# Altium schematic symbol library SCHLIB.SchLib: 2608 symbols (part 2 of 20)
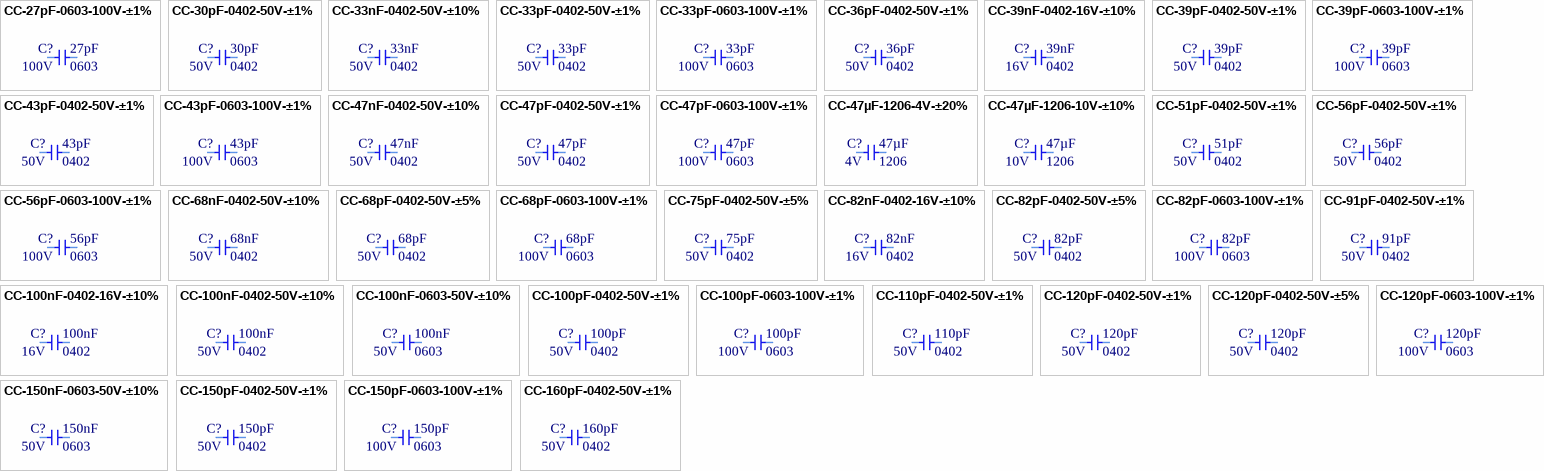
[diagram p84: symbols CC-27pF-0603-100V-±1% to CC-160pF-0402-50V-±1%]

## CC-160pF-0402-50V-±1%
designator C?, comment Voltage - Rated: 50V  Package: 0402  (hidden comment: 160pF)
CAP CER 160PF 50V C0G/NP0 0402; Manufacturer Part Number: GCM1555C1H161FA16D; Manufacturer: Murata Electronics; Tolerance: ±1%; Temperature Coefficient: C0G; Object  Type: Part; Design Item ID: CC-160pF-0402-50V-±1%; Series: GCM; Operating Temperature: -55°C ~ 125°C; Features: -; Ratings: AEC-Q200; Applications: Automotive; Failure Rate: -; Mounting Type: Surface Mount, MLCC; Size: 1.00mm x 0.50mm; Height: -; Thickness: 0.55mm; Category: Capacitor; Value: 160pF
footprint CC0402
pins: 1, 2

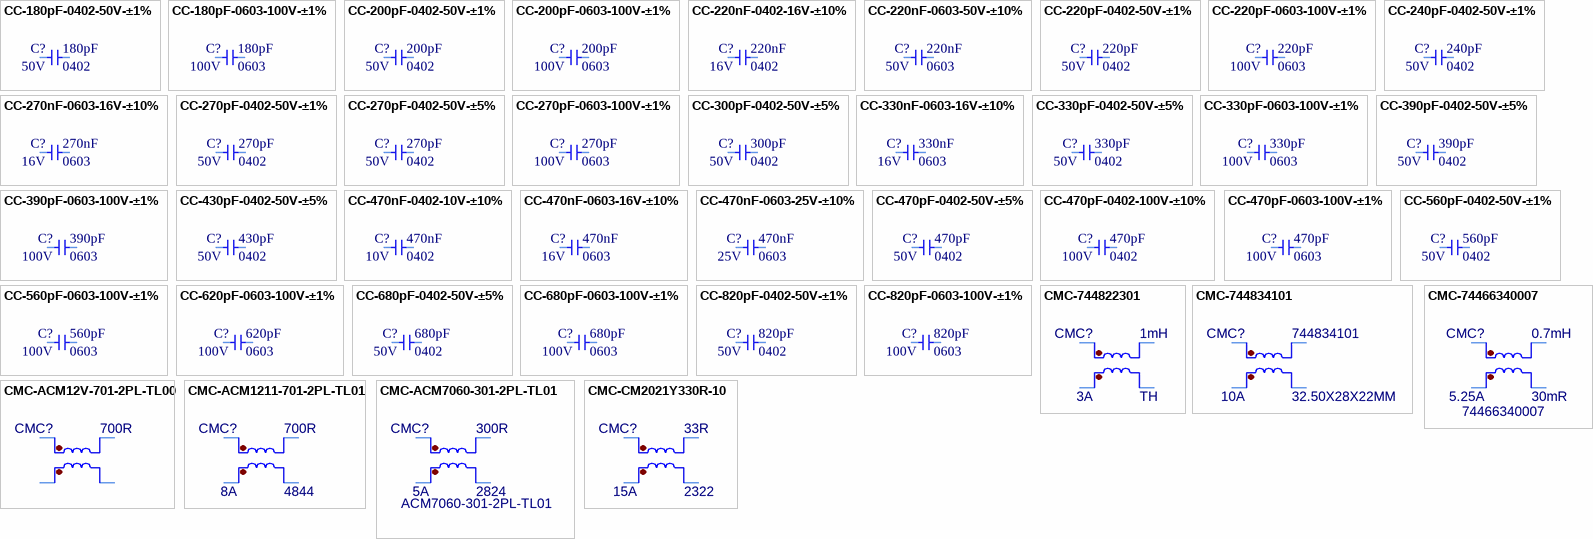
[diagram p4: symbols CC-180pF-0402-50V-±1% to CMC-CM2021Y330R-10]

## CC-180pF-0402-50V-±1%
designator C?, comment Voltage - Rated: 50V  Package: 0402  (hidden comment: 180pF)
CAP CER 180PF 50V C0G/NP0 0402; Manufacturer Part Number: GCM1555C1H181FA16D; Manufacturer: Murata Electronics; Tolerance: ±1%; Temperature Coefficient: C0G; Object  Type: Part; Design Item ID: CC-180pF-0402-50V-±1%; Series: GCM; Operating Temperature: -55°C ~ 125°C; Features: -; Ratings: AEC-Q200; Applications: Automotive; Failure Rate: -; Mounting Type: Surface Mount, MLCC; Size: 1.00mm x 0.50mm; Height: -; Thickness: 0.55mm; Category: Capacitor; Value: 180pF
footprint CC0402
pins: 1, 2

## CC-180pF-0603-100V-±1%
designator C?, comment Voltage - Rated: 100V  Package: 0603  (hidden comment: 180pF)
CAP CER 180PF 100V C0G/NP0 0603; Manufacturer Part Number: GCM1885C2A181FA16D; Manufacturer: Murata Electronics; Tolerance: ±1%; Temperature Coefficient: C0G; Object  Type: Part; Design Item ID: CC-180pF-0603-100V-±1%; Series: GCM; Operating Temperature: -55°C ~ 125°C; Features: -; Ratings: AEC-Q200; Applications: Automotive; Failure Rate: -; Mounting Type: Surface Mount, MLCC; Size: 1.60mm x 0.80mm; Height: -; Thickness: 0.90mm; Category: Capacitor; Value: 180pF
footprint CC0603
pins: 1, 2

## CC-200pF-0402-50V-±1%
designator C?, comment Voltage - Rated: 50V  Package: 0402  (hidden comment: 200pF)
CAP CER 200PF 50V C0G/NP0 0402; Manufacturer Part Number: GCM1555C1H201FA16D; Manufacturer: Murata Electronics; Tolerance: ±1%; Temperature Coefficient: C0G; Object  Type: Part; Design Item ID: CC-200pF-0402-50V-±1%; Series: GCM; Operating Temperature: -55°C ~ 125°C; Features: -; Ratings: AEC-Q200; Applications: Automotive; Failure Rate: -; Mounting Type: Surface Mount, MLCC; Size: 1.00mm x 0.50mm; Height: -; Thickness: 0.55mm; Category: Capacitor; Value: 200pF
footprint CC0402
pins: 1, 2

## CC-200pF-0603-100V-±1%
designator C?, comment Voltage - Rated: 100V  Package: 0603  (hidden comment: 200pF)
CAP CER 200PF 100V C0G/NP0 0603; Manufacturer Part Number: GCM1885C2A201FA16J; Manufacturer: Murata Electronics; Tolerance: ±1%; Temperature Coefficient: C0G; Object  Type: Part; Design Item ID: CC-200pF-0603-100V-±1%; Series: GCM; Operating Temperature: -55°C ~ 125°C; Features: -; Ratings: AEC-Q200; Applications: Automotive; Failure Rate: -; Mounting Type: Surface Mount, MLCC; Size: 1.60mm x 0.80mm; Height: -; Thickness: 0.90mm; Category: Capacitor; Value: 200pF
footprint CC0603
pins: 1, 2

## CC-220nF-0402-16V-±10%
designator C?, comment Voltage - Rated: 16V  Package: 0402  (hidden comment: 220nF)
CAP CER 0.22UF 16V X7R 0402; Manufacturer Part Number: GCM155R71C224KE02D; Manufacturer: Murata Electronics; Tolerance: ±10%; Temperature Coefficient: C0G; Object  Type: Part; Design Item ID: CC-220nF-0402-16V-±10%; Series: GCM; Operating Temperature: -55°C ~ 125°C; Features: -; Ratings: AEC-Q200; Applications: Automotive; Failure Rate: -; Mounting Type: Surface Mount, MLCC; Size: 1.00mm x 0.50mm; Height: -; Thickness: 0.55mm; Category: Capacitor; Value: 220nF
footprint CC0402
pins: 1, 2

## CC-220nF-0603-50V-±10%
designator C?, comment Voltage - Rated: 50V  Package: 0603  (hidden comment: 220nF)
CAP CER 0.22UF 50V X7R 0603; Manufacturer Part Number: GCM188R71H224KA64D; Manufacturer: Murata Electronics; Tolerance: ±10%; Object  Type: Part; Design Item ID: CC-220nF-0603-50V-±10%; Series: GCM; Temperature Coefficient: X7R; Operating Temperature: -55°C ~ 125°C; Features: -; Ratings: AEC-Q200; Applications: Automotive; Failure Rate: -; Mounting Type: Surface Mount, MLCC; Size: 1.60mm x 0.80mm; Height: -; Thickness: 0.90mm; Category: Capacitor; Value: 220nF
footprint CC0603
pins: 1, 2

## CC-220pF-0402-50V-±1%
designator C?, comment Voltage - Rated: 50V  Package: 0402  (hidden comment: 220pF)
CAP CER 220PF 50V C0G/NP0 0402; Manufacturer Part Number: GCM1555C1H221FA16D; Manufacturer: Murata Electronics; Tolerance: ±1%; Temperature Coefficient: C0G; Object  Type: Part; Design Item ID: CC-220pF-0402-50V-±1%; Series: GCM; Operating Temperature: -55°C ~ 125°C; Features: -; Ratings: AEC-Q200; Applications: Automotive; Failure Rate: -; Mounting Type: Surface Mount, MLCC; Size: 1.00mm x 0.50mm; Height: -; Thickness: 0.55mm; Category: Capacitor; Value: 220pF
footprint CC0402
pins: 1, 2

## CC-220pF-0603-100V-±1%
designator C?, comment Voltage - Rated: 100V  Package: 0603  (hidden comment: 220pF)
CAP CER 220PF 100V C0G/NP0 0603; Manufacturer Part Number: GCM1885C2A221FA16D; Manufacturer: Murata Electronics; Tolerance: ±1%; Temperature Coefficient: C0G; Object  Type: Part; Design Item ID: CC-220pF-0603-100V-±1%; Series: GCM; Operating Temperature: -55°C ~ 125°C; Features: -; Ratings: AEC-Q200; Applications: Automotive; Failure Rate: -; Mounting Type: Surface Mount, MLCC; Size: 1.60mm x 0.80mm; Height: -; Thickness: 0.90mm; Category: Capacitor; Value: 220pF
footprint CC0603
pins: 1, 2

## CC-240pF-0402-50V-±1%
designator C?, comment Voltage - Rated: 50V  Package: 0402  (hidden comment: 240pF)
CAP CER 240PF 50V C0G/NP0 0402; Manufacturer Part Number: GCM1555C1H241FA16D; Manufacturer: Murata Electronics; Tolerance: ±1%; Temperature Coefficient: C0G; Object  Type: Part; Design Item ID: CC-240pF-0402-50V-±1%; Series: GCM; Operating Temperature: -55°C ~ 125°C; Features: -; Ratings: AEC-Q200; Applications: Automotive; Failure Rate: -; Mounting Type: Surface Mount, MLCC; Size: 1.00mm x 0.50mm; Height: -; Thickness: 0.55mm; Category: Capacitor; Value: 240pF
footprint CC0402
pins: 1, 2

## CC-270nF-0603-16V-±10%
designator C?, comment Voltage - Rated: 16V  Package: 0603  (hidden comment: 270nF)
CAP CER 0.27UF 16V X7R 0603; Manufacturer Part Number: GCM188R71C274KA37D; Manufacturer: Murata Electronics; Tolerance: ±10%; Object  Type: Part; Design Item ID: CC-270nF-0603-16V-±10%; Series: GCM; Temperature Coefficient: X7R; Operating Temperature: -55°C ~ 125°C; Features: -; Ratings: AEC-Q200; Applications: Automotive; Failure Rate: -; Mounting Type: Surface Mount, MLCC; Size: 1.60mm x 0.80mm; Height: -; Thickness: 0.90mm; Category: Capacitor; Value: 270nF
footprint CC0603
pins: 1, 2

## CC-270pF-0402-50V-±1%
designator C?, comment Voltage - Rated: 50V  Package: 0402  (hidden comment: 270pF)
CAP CER 270PF 50V C0G/NP0 0402; Manufacturer Part Number: GCM1555C1H271FA16D; Manufacturer: Murata Electronics; Tolerance: ±1%; Temperature Coefficient: C0G; Object  Type: Part; Design Item ID: CC-270pF-0402-50V-±1%; Series: GCM; Operating Temperature: -55°C ~ 125°C; Features: -; Ratings: AEC-Q200; Applications: Automotive; Failure Rate: -; Mounting Type: Surface Mount, MLCC; Size: 1.00mm x 0.50mm; Height: -; Thickness: 0.55mm; Category: Capacitor; Value: 270pF
footprint CC0402
pins: 1, 2

## CC-270pF-0402-50V-±5%
designator C?, comment Voltage - Rated: 50V  Package: 0402  (hidden comment: 270pF)
CAP CER 270PF 50V C0G/NP0 0402; Manufacturer Part Number: GCM1555C1H271JA16D; Manufacturer: Murata Electronics; Tolerance: ±5%; Temperature Coefficient: C0G; Object  Type: Part; Design Item ID: CC-270pF-0402-50V-±5%; Series: GCM; Operating Temperature: -55°C ~ 125°C; Features: -; Ratings: AEC-Q200; Applications: Automotive; Failure Rate: -; Mounting Type: Surface Mount, MLCC; Size: 1.00mm x 0.50mm; Height: -; Thickness: 0.55mm; Category: Capacitor; Value: 270pF
footprint CC0402
pins: 1, 2

## CC-270pF-0603-100V-±1%
designator C?, comment Voltage - Rated: 100V  Package: 0603  (hidden comment: 270pF)
CAP CER 270PF 100V C0G/NP0 0603; Manufacturer Part Number: GCM1885C2A271FA16D; Manufacturer: Murata Electronics; Tolerance: ±1%; Temperature Coefficient: C0G; Object  Type: Part; Design Item ID: CC-270pF-0603-100V-±1%; Series: GCM; Operating Temperature: -55°C ~ 125°C; Features: -; Ratings: AEC-Q200; Applications: Automotive; Failure Rate: -; Mounting Type: Surface Mount, MLCC; Size: 1.60mm x 0.80mm; Height: -; Thickness: 0.90mm; Category: Capacitor; Value: 270pF
footprint CC0603
pins: 1, 2

## CC-300pF-0402-50V-±5%
designator C?, comment Voltage - Rated: 50V  Package: 0402  (hidden comment: 300pF)
CAP CER 300PF 50V NP0 0402; Manufacturer Part Number: GCM1555C1H301JA16D; Manufacturer: Murata Electronics; Tolerance: ±5%; Temperature Coefficient: C0G; Object  Type: Part; Design Item ID: CC-300pF-0402-50V-±5%; Series: GCM; Operating Temperature: -55°C ~ 125°C; Features: -; Ratings: AEC-Q200; Applications: Automotive; Failure Rate: -; Mounting Type: Surface Mount, MLCC; Size: 1.00mm x 0.50mm; Height: -; Thickness: 0.55mm; Category: Capacitor; Value: 300pF
footprint CC0402
pins: 1, 2

## CC-330nF-0603-16V-±10%
designator C?, comment Voltage - Rated: 16V  Package: 0603  (hidden comment: 330nF)
CAP CER 0.33UF 16V X7R 0603; Manufacturer Part Number: GCM188R71C334KA37D; Manufacturer: Murata Electronics; Tolerance: ±10%; Object  Type: Part; Design Item ID: CC-330nF-0603-16V-±10%; Series: GCM; Temperature Coefficient: X7R; Operating Temperature: -55°C ~ 125°C; Features: -; Ratings: AEC-Q200; Applications: Automotive; Failure Rate: -; Mounting Type: Surface Mount, MLCC; Size: 1.60mm x 0.80mm; Height: -; Thickness: 0.90mm; Category: Capacitor; Value: 330nF
footprint CC0603
pins: 1, 2

## CC-330pF-0402-50V-±5%
designator C?, comment Voltage - Rated: 50V  Package: 0402  (hidden comment: 330pF)
CAP CER 330PF 50V C0G/NP0 0402; Manufacturer Part Number: GCM1555C1H331JA16D; Manufacturer: Murata Electronics; Tolerance: ±5%; Temperature Coefficient: C0G; Object  Type: Part; Design Item ID: CC-330pF-0402-50V-±5%; Series: GCM; Operating Temperature: -55°C ~ 125°C; Features: -; Ratings: AEC-Q200; Applications: Automotive; Failure Rate: -; Mounting Type: Surface Mount, MLCC; Size: 1.00mm x 0.50mm; Height: -; Thickness: 0.55mm; Category: Capacitor; Value: 330pF
footprint CC0402
pins: 1, 2

## CC-330pF-0603-100V-±1%
designator C?, comment Voltage - Rated: 100V  Package: 0603  (hidden comment: 330pF)
CAP CER 330PF 100V C0G/NP0 0603; Manufacturer Part Number: GCM1885C2A331FA16D; Manufacturer: Murata Electronics; Tolerance: ±1%; Temperature Coefficient: C0G; Object  Type: Part; Design Item ID: CC-330pF-0603-100V-±1%; Series: GCM; Operating Temperature: -55°C ~ 125°C; Features: -; Ratings: AEC-Q200; Applications: Automotive; Failure Rate: -; Mounting Type: Surface Mount, MLCC; Size: 1.60mm x 0.80mm; Height: -; Thickness: 0.90mm; Category: Capacitor; Value: 330pF
footprint CC0603
pins: 1, 2

## CC-390pF-0402-50V-±5%
designator C?, comment Voltage - Rated: 50V  Package: 0402  (hidden comment: 390pF)
CAP CER 390PF 50V C0G/NP0 0402; Manufacturer Part Number: GCM1555C1H391JA16D; Manufacturer: Murata Electronics; Tolerance: ±5%; Temperature Coefficient: C0G; Object  Type: Part; Design Item ID: CC-390pF-0402-50V-±5%; Series: GCM; Operating Temperature: -55°C ~ 125°C; Features: -; Ratings: AEC-Q200; Applications: Automotive; Failure Rate: -; Mounting Type: Surface Mount, MLCC; Size: 1.00mm x 0.50mm; Height: -; Thickness: 0.55mm; Category: Capacitor; Value: 390pF
footprint CC0402
pins: 1, 2

## CC-390pF-0603-100V-±1%
designator C?, comment Voltage - Rated: 100V  Package: 0603  (hidden comment: 390pF)
CAP CER 390PF 100V C0G/NP0 0603; Manufacturer Part Number: GCM1885C2A391FA16D; Manufacturer: Murata Electronics; Tolerance: ±1%; Temperature Coefficient: C0G; Object  Type: Part; Design Item ID: CC-390pF-0603-100V-±1%; Series: GCM; Operating Temperature: -55°C ~ 125°C; Features: -; Ratings: AEC-Q200; Applications: Automotive; Failure Rate: -; Mounting Type: Surface Mount, MLCC; Size: 1.60mm x 0.80mm; Height: -; Thickness: 0.90mm; Category: Capacitor; Value: 390pF
footprint CC0603
pins: 1, 2

## CC-430pF-0402-50V-±5%
designator C?, comment Voltage - Rated: 50V  Package: 0402  (hidden comment: 430pF)
CAP CER 430PF 50V NP0 0402; Manufacturer Part Number: GCM1555C1H431JA16D; Manufacturer: Murata Electronics; Tolerance: ±5%; Temperature Coefficient: C0G; Object  Type: Part; Design Item ID: CC-430pF-0402-50V-±5%; Series: GCM; Operating Temperature: -55°C ~ 125°C; Features: -; Ratings: AEC-Q200; Applications: Automotive; Failure Rate: -; Mounting Type: Surface Mount, MLCC; Size: 1.00mm x 0.50mm; Height: -; Thickness: 0.55mm; Category: Capacitor; Value: 430pF
footprint CC0402
pins: 1, 2

## CC-470nF-0402-10V-±10%
designator C?, comment Voltage - Rated: 10V  Package: 0402  (hidden comment: 470nF)
CAP CER 0.47UF 10V X7S 0402; Manufacturer Part Number: GCM155C71A474KE36D; Manufacturer: Murata Electronics; Tolerance: ±10%; Temperature Coefficient: C0G; Object  Type: Part; Design Item ID: CC-470nF-0402-10V-±10%; Series: GCM; Operating Temperature: -55°C ~ 125°C; Features: -; Ratings: AEC-Q200; Applications: Automotive; Failure Rate: -; Mounting Type: Surface Mount, MLCC; Size: 1.00mm x 0.50mm; Height: -; Thickness: 0.60mm; Category: Capacitor; Value: 470nF
footprint CC0402
pins: 1, 2

## CC-470nF-0603-16V-±10%
designator C?, comment Voltage - Rated: 16V  Package: 0603  (hidden comment: 470nF)
CAP CER 0.47UF 16V X7R 0603; Manufacturer Part Number: GCM188R71C474KA55D; Manufacturer: Murata Electronics; Tolerance: ±10%; Object  Type: Part; Design Item ID: CC-470nF-0603-16V-±10%; Series: GCM; Temperature Coefficient: X7R; Operating Temperature: -55°C ~ 125°C; Features: -; Ratings: AEC-Q200; Applications: Automotive; Failure Rate: -; Mounting Type: Surface Mount, MLCC; Size: 1.60mm x 0.80mm; Height: -; Thickness: 0.90mm; Category: Capacitor; Value: 470nF
footprint CC0603
pins: 1, 2

## CC-470nF-0603-25V-±10%
designator C?, comment Voltage - Rated: 25V  Package: 0603  (hidden comment: 470nF)
CAP CER 0.47UF 25V X7R 0603; Manufacturer Part Number: GCM188R71E474KA64D; Manufacturer: Murata Electronics; Tolerance: ±10%; Object  Type: Part; Design Item ID: CC-470nF-0603-25V-±10%; Series: GCM; Temperature Coefficient: X7R; Operating Temperature: -55°C ~ 125°C; Features: -; Ratings: AEC-Q200; Applications: Automotive; Failure Rate: -; Mounting Type: Surface Mount, MLCC; Size: 1.60mm x 0.80mm; Height: -; Thickness: 0.90mm; Category: Capacitor; Value: 470nF
footprint CC0603
pins: 1, 2

## CC-470pF-0402-50V-±5%
designator C?, comment Voltage - Rated: 50V  Package: 0402  (hidden comment: 470pF)
CAP CER 470PF 50V C0G/NP0 0402; Manufacturer Part Number: GCM1555C1H471JA16D; Manufacturer: Murata Electronics; Tolerance: ±5%; Temperature Coefficient: C0G; Object  Type: Part; Design Item ID: CC-470pF-0402-50V-±5%; Series: GCM; Operating Temperature: -55°C ~ 125°C; Features: -; Ratings: AEC-Q200; Applications: Automotive; Failure Rate: -; Mounting Type: Surface Mount, MLCC; Size: 1.00mm x 0.50mm; Height: -; Thickness: 0.55mm; Category: Capacitor; Value: 470pF
footprint CC0402
pins: 1, 2

## CC-470pF-0402-100V-±10%
designator C?, comment Voltage - Rated: 100V  Package: 0402  (hidden comment: 470pF)
CAP CER 470PF 100V X7R 0402; Manufacturer Part Number: GCM155R72A471KA37D; Manufacturer: Murata Electronics; Tolerance: ±10%; Temperature Coefficient: C0G; Object  Type: Part; Design Item ID: CC-470pF-0402-100V-±10%; Series: GCM; Operating Temperature: -55°C ~ 125°C; Features: -; Ratings: AEC-Q200; Applications: Automotive; Failure Rate: -; Mounting Type: Surface Mount, MLCC; Size: 1.00mm x 0.50mm; Height: -; Thickness: 0.55mm; Category: Capacitor; Value: 470pF
footprint CC0402
pins: 1, 2

## CC-470pF-0603-100V-±1%
designator C?, comment Voltage - Rated: 100V  Package: 0603  (hidden comment: 470pF)
CAP CER 470PF 100V C0G/NP0 0603; Manufacturer Part Number: GCM1885C2A471FA16D; Manufacturer: Murata Electronics; Tolerance: ±1%; Temperature Coefficient: C0G; Object  Type: Part; Design Item ID: CC-470pF-0603-100V-±1%; Series: GCM; Operating Temperature: -55°C ~ 125°C; Features: -; Ratings: AEC-Q200; Applications: Automotive; Failure Rate: -; Mounting Type: Surface Mount, MLCC; Size: 1.60mm x 0.80mm; Height: -; Thickness: 0.90mm; Category: Capacitor; Value: 470pF
footprint CC0603
pins: 1, 2

## CC-560pF-0402-50V-±1%
designator C?, comment Voltage - Rated: 50V  Package: 0402  (hidden comment: 560pF)
CAP CER 560PF 50V C0G/NP0 0402; Manufacturer Part Number: GCM1555C1H561FA16D; Manufacturer: Murata Electronics; Tolerance: ±1%; Temperature Coefficient: C0G; Object  Type: Part; Design Item ID: CC-560pF-0402-50V-±1%; Series: GCM; Operating Temperature: -55°C ~ 125°C; Features: -; Ratings: AEC-Q200; Applications: Automotive; Failure Rate: -; Mounting Type: Surface Mount, MLCC; Size: 1.00mm x 0.50mm; Height: -; Thickness: 0.55mm; Category: Capacitor; Value: 560pF
footprint CC0402
pins: 1, 2

## CC-560pF-0603-100V-±1%
designator C?, comment Voltage - Rated: 100V  Package: 0603  (hidden comment: 560pF)
CAP CER 560PF 100V C0G/NP0 0603; Manufacturer Part Number: GCM1885C2A561FA16D; Manufacturer: Murata Electronics; Tolerance: ±1%; Temperature Coefficient: C0G; Object  Type: Part; Design Item ID: CC-560pF-0603-100V-±1%; Series: GCM; Operating Temperature: -55°C ~ 125°C; Features: -; Ratings: AEC-Q200; Applications: Automotive; Failure Rate: -; Mounting Type: Surface Mount, MLCC; Size: 1.60mm x 0.80mm; Height: -; Thickness: 0.90mm; Category: Capacitor; Value: 560pF
footprint CC0603
pins: 1, 2

## CC-620pF-0603-100V-±1%
designator C?, comment Voltage - Rated: 100V  Package: 0603  (hidden comment: 620pF)
CAP CER 620PF 100V C0G/NP0 0603; Manufacturer Part Number: GCM1885C2A621FA16J; Manufacturer: Murata Electronics; Tolerance: ±1%; Temperature Coefficient: C0G; Object  Type: Part; Design Item ID: CC-620pF-0603-100V-±1%; Series: GCM; Operating Temperature: -55°C ~ 125°C; Features: -; Ratings: AEC-Q200; Applications: Automotive; Failure Rate: -; Mounting Type: Surface Mount, MLCC; Size: 1.60mm x 0.80mm; Height: -; Thickness: 0.90mm; Category: Capacitor; Value: 620pF
footprint CC0603
pins: 1, 2

## CC-680pF-0402-50V-±5%
designator C?, comment Voltage - Rated: 50V  Package: 0402  (hidden comment: 680pF)
CAP CER 680PF 50V C0G/NP0 0402; Manufacturer Part Number: GCM1555C1H681JA16D; Manufacturer: Murata Electronics; Tolerance: ±5%; Temperature Coefficient: C0G; Object  Type: Part; Design Item ID: CC-680pF-0402-50V-±5%; Series: GCM; Operating Temperature: -55°C ~ 125°C; Features: -; Ratings: AEC-Q200; Applications: Automotive; Failure Rate: -; Mounting Type: Surface Mount, MLCC; Size: 1.00mm x 0.50mm; Height: -; Thickness: 0.55mm; Category: Capacitor; Value: 680pF
footprint CC0402
pins: 1, 2

## CC-680pF-0603-100V-±1%
designator C?, comment Voltage - Rated: 100V  Package: 0603  (hidden comment: 680pF)
CAP CER 680PF 100V C0G/NP0 0603; Manufacturer Part Number: GCM1885C2A681FA16D; Manufacturer: Murata Electronics; Tolerance: ±1%; Temperature Coefficient: C0G; Object  Type: Part; Design Item ID: CC-680pF-0603-100V-±1%; Series: GCM; Operating Temperature: -55°C ~ 125°C; Features: -; Ratings: AEC-Q200; Applications: Automotive; Failure Rate: -; Mounting Type: Surface Mount, MLCC; Size: 1.60mm x 0.80mm; Height: -; Thickness: 0.90mm; Category: Capacitor; Value: 680pF
footprint CC0603
pins: 1, 2

## CC-820pF-0402-50V-±1%
designator C?, comment Voltage - Rated: 50V  Package: 0402  (hidden comment: 820pF)
CAP CER 820PF 50V C0G/NP0 0402; Manufacturer Part Number: GCM1555C1H821FA16D; Manufacturer: Murata Electronics; Tolerance: ±1%; Temperature Coefficient: C0G; Object  Type: Part; Design Item ID: CC-820pF-0402-50V-±1%; Series: GCM; Operating Temperature: -55°C ~ 125°C; Features: -; Ratings: AEC-Q200; Applications: Automotive; Failure Rate: -; Mounting Type: Surface Mount, MLCC; Size: 1.00mm x 0.50mm; Height: -; Thickness: 0.55mm; Category: Capacitor; Value: 820pF
footprint CC0402
pins: 1, 2

## CC-820pF-0603-100V-±1%
designator C?, comment Package: 0603  Voltage - Rated: 100V  (hidden comment: 820pF)
CAP CER 820PF 100V C0G/NP0 0603; Manufacturer Part Number: GCM1885C2A821FA16D; Manufacturer: Murata Electronics; Temperature Coefficient: C0G; Object  Type: Part; Tolerance: ±1%; Design Item ID: CC-820pF-0603-100V-±1%; Series: GCM; Operating Temperature: -55°C ~ 125°C; Features: -; Ratings: AEC-Q200; Applications: Automotive; Failure Rate: -; Mounting Type: Surface Mount, MLCC; Size: 1.60mm x 0.80mm; Height: -; Thickness: 0.90mm; Category: Capacitor; Value: 820pF
footprint CC0603
pins: 1, 2

## CMC-744822301
designator CMC?, comment Max DC Current: 3A  Case/Package: TH  (hidden comment: 1mH)
CMC 1MH 3A 2LN TH; Manufacturer: Wurth Electronics; Manufacturer Part Number: 744822301; Tolerance: 30%; Number of Lines: 2; DC Resistance (DCR): 35mR; Test Frequency: 10kHz; Washability: OK; Supplier 1: Digi-Key; Stock 1: 422; Pricing 1: 1=4.29, 10=4.222, 50=3.349, 140=3.203, 280=2.912 (USD); Mount: Radial,Through Hole; Number of Pins: 4; Min Operating Temperature: -40°C; Max Operating Temperature: 125°C; Package Quantity: 140; Packaging: Bulk; Current: 3A; Termination: Radial; Inductance Tolerance: 30%; Resistance: 35MR; Current Rating: 3A; Series Resistance: 35mR; Length: 17.5mm; Height: 22mm; Width: 13mm; Depth: 13mm; Lead Pitch: 7.7mm; REACH SVHC: No SVHC; Lead Free: Lead Free; ComponentLink1URL: http://documents.rs-components.com/techlib://itc_doclist_GB.htm?stockno=4890201; ComponentLink1Description: http://documents.rs-components.com/techlib://itc_doclist_GB.htm?stockno=4890201; ComponentLink2URL: https://katalog.we-online.de/pbs/datasheet/744822301.pdf; ComponentLink2Description: https://katalog.we-online.de/pbs/datasheet/744822301.pdf; ComponentLink3URL: http://www.mouser.com/ds/2/445/744822301-91864.pdf; ComponentLink3Description: http://www.mouser.com/ds/2/445/744822301-91864.pdf; ComponentLink4URL: http://www.farnell.com/datasheets/1736520.pdf; ComponentLink4Description: http://www.farnell.com/datasheets/1736520.pdf; Supplier Part Number 1: 732-1439-ND; Inductance: 1mH
pins: 1, 2, 3, 4

## CMC-744834101
designator CMC?, comment 744834101  Current Rating (Max): 10A  Package: 32.50X28X22MM
COMMON MODE CHOKE 1MH 10A 2LN TH; Washability: OK
footprint CMC-744834101
pins: 1, 2, 3, 4

## CMC-74466340007
designator CMC?, comment 74466340007  Current: 5.25A  DC Resistance (DCR): 30mR  Inductance: 0.7mH
CHOKE COM MODE .7MH 4.0A SMD; Manufacturer: Wurth Electronics; Number of Lines: 2; Tolerance: 30%; Max DC Current: 4A; Washability: OK; Supplier 1: Digi-Key; Manufacturer Part Number: 74466340007; Stock 1: 1416; Pricing 1: 1=6.05000, 10=5.88000, 50=5.60000, 100=5.32000 (USD); RoHS: Yes; Mount: Surface Mount; Case/Package: SMD/SMT; Min Operating Temperature: -40°C; Max Operating Temperature: 125°C; Package Quantity: 1; Packaging: Tape and Reel; Length: 0.917inch; Height: 0.453inch; Width: 0.728inch; Depth: 23.3mm; ComponentLink1URL: https://datasheet.ciiva.com/1008/74466340007-1008595.pdf?src-supplier=Digi-Key; ComponentLink1Description: https://datasheet.ciiva.com/1008/74466340007-1008595.pdf?src-supplier=Digi-Key; ComponentLink2URL: https://datasheet.ciiva.com/11800/0900766b80d89638-11800510.pdf?src-supplier=RSComponents; ComponentLink2Description: https://datasheet.ciiva.com/11800/0900766b80d89638-11800510.pdf?src-supplier=RSComponents; ComponentLink3URL: https://datasheet.ciiva.com/1008/74466340007-1008596.pdf?src-supplier=Digi-Key; ComponentLink3Description: https://datasheet.ciiva.com/1008/74466340007-1008596.pdf?src-supplier=Digi-Key; ComponentLink4URL: https://datasheet.ciiva.com/1008/74466340007-1008597.pdf?src-supplier=Digi-Key; ComponentLink4Description: https://datasheet.ciiva.com/1008/74466340007-1008597.pdf?src-supplier=Digi-Key; Supplier Part Number 1: 732-1858-1-ND
footprint SMD23.3x18.5x11.5_4P (SMD Common Mode Power Line Choke, 4 leads)
pins: 1, 2, 3, 4

## CMC-ACM12V-701-2PL-TL00
designator CMC?, comment 700R
CMC 8A 2LN 700 OHM SMD AEC-Q200; Manufacturer: TDK EPCOS; Manufacturer Part Number: ACM12V-701-2PL-TL00; Core Material: Ferrite; Number of Lines: 2; DC Resistance (DCR): 6mR; Test Frequency: 100MHz; Insulation Resistance: 10MR; Shielding: Shielded; Washability: OK; ComponentLink1URL: https://datasheet.ciiva.com/1126/320973-1126960.pdf?src-supplier=Element14; ComponentLink1Description: https://datasheet.ciiva.com/1126/320973-1126960.pdf?src-supplier=Element14; ComponentLink2URL: https://datasheet.ciiva.com/6214/e9713-acm-v-6214330.pdf?src-supplier=Digi-Key; ComponentLink2Description: https://datasheet.ciiva.com/6214/e9713-acm-v-6214330.pdf?src-supplier=Digi-Key; ComponentLink3URL: https://datasheet.ciiva.com/6214/e9713-acm-v-6214331.pdf?src-supplier=Digi-Key; ComponentLink3Description: https://datasheet.ciiva.com/6214/e9713-acm-v-6214331.pdf?src-supplier=Digi-Key; ComponentLink4URL: https://datasheet.ciiva.com/4942/e9713-acm-v-13660-4942158.pdf?src-supplier=Mouser; ComponentLink4Description: https://datasheet.ciiva.com/4942/e9713-acm-v-13660-4942158.pdf?src-supplier=Mouser; Supplier 1: Digi-Key; Supplier Part Number 1: 445-4083-1-ND; Stock 1: 65877; Pricing 1: 1=2.71000, 10=2.50500, 100=1.75330 (USD); RoHS: Yes; Mount: Surface Mount; Case/Package: V; Case Code (Metric): 1211; Min Operating Temperature: -40°C; Max Operating Temperature: 125°C; Impedance: 700R; Package Quantity: 1; Packaging: Tape and Reel; Current Rating: 8A; Current: 8A; Max DC Current: 8A; Termination: SMD/SMT; DC Current: 8A; Length: 12mm; Height: 6mm; Width: 0.433inch; Depth: 11.3mm; REACH SVHC: No SVHC; Lead Free: Lead Free
footprint CMC-ACM12V-701-2PL-TL00 (CMC 8A 2LN 700 OHM SMD AEC-Q200)
pins: 1, 2, 3, 4

## CMC-ACM1211-701-2PL-TL01
designator CMC?, comment Max DC Current: 8A  Case/Package: 4844  (hidden comment: 700R)
CMC 8A 2LN 700 OHM SMD; Manufacturer: TDK; Manufacturer Part Number: ACM1211-701-2PL-TL01; Number of Lines: 2; Voltage Rating: 50V; DC Resistance (DCR): 6mR; Test Frequency: 100MHz; Voltage Rating (DC): 80V; Element Configuration: Dual; Shielding: Unshielded; Washability: OK; Supplier 1: Digi-Key; Stock 1: 30969; Pricing 1: 1=2.47, 10=2.277, 100=1.5939 (USD); Mount: Surface Mount; Number of Pins: 4; Min Operating Temperature: -40°C; Max Operating Temperature: 85°C; Packaging: Tape and Reel; Number of Elements: 2; Package Quantity: 1; Current Rating: 8A; Termination: SMD/SMT; Current: 8A; Length: 12.3mm; Height: 6mm; Width: 11mm; Depth: 11.3mm; Radiation Hardening: No; Lead Free: Lead Free; ComponentLink1URL: https://product.tdk.com/info/en/catalog/datasheets/cmf_commercial_power_acm1211_en.pdf; ComponentLink1Description: https://product.tdk.com/info/en/catalog/datasheets/cmf_commercial_power_acm1211_en.pdf; ComponentLink2URL: http://www.tdk.co.jp/tefe02/e9713_acm.pdf; ComponentLink2Description: http://www.tdk.co.jp/tefe02/e9713_acm.pdf; DC Current: 8A; Supplier Part Number 1: 445-2212-6-ND; Impedance: 700R
pins: 1, 2, 3, 4

## CMC-ACM7060-301-2PL-TL01
designator CMC?, comment ACM7060-301-2PL-TL01  Impedance: 300R  Case/Package: 2824  DC Current: 5A
CMC 5A 2LN 300 OHM SMD; Manufacturer: TDK; DC Resistance (DCR): 10mR; Test Frequency: 100MHz; Voltage Rating (DC): 80V; Number of Lines: 2; Element Configuration: Dual; Shielding: Unshielded; Washability: OK; Supplier 1: Digi-Key; Supplier Part Number 1: 445-2214-1-ND; Manufacturer Part Number: ACM7060-301-2PL-TL01; Stock 1: 72217; Pricing 1: 1=2.02000, 10=1.86300, 100=1.30410, 500=1.05570 (USD); RoHS: Yes; Mount: Surface Mount; Number of Pins: 4; Min Operating Temperature: -40°C; Max Operating Temperature: 85°C; Package Quantity: 1; Packaging: Tape and Reel; Max DC Current: 5A; Termination: SMD/SMT; Voltage Rating: 80V; Current Rating: 5A; Current: 5A; Insulation Resistance: 10MR; Length: 7.2mm; Height: 3.5mm; Width: 0.236inch; Depth: 6.2mm; Radiation Hardening: No; REACH SVHC: No SVHC; Lead Free: Lead Free; ComponentLink1URL: https://datasheet.ciiva.com/15191/getdatasheetpartid-659291-15191802.pdf?src-supplier=Verical; ComponentLink1Description: https://datasheet.ciiva.com/15191/getdatasheetpartid-659291-15191802.pdf?src-supplier=Verical; ComponentLink2URL: https://datasheet.ciiva.com/6216/e9713-acm-6216069.pdf?src-supplier=Digi-Key; ComponentLink2Description: https://datasheet.ciiva.com/6216/e9713-acm-6216069.pdf?src-supplier=Digi-Key; ComponentLink3URL: https://datasheet.ciiva.com/4942/e9713-acm-16715-4942071.pdf?src-supplier=Mouser; ComponentLink3Description: https://datasheet.ciiva.com/4942/e9713-acm-16715-4942071.pdf?src-supplier=Mouser; ComponentLink4URL: https://datasheet.ciiva.com/6216/e9713-acm-6216072.pdf?src-supplier=Digi-Key; ComponentLink4Description: https://datasheet.ciiva.com/6216/e9713-acm-6216072.pdf?src-supplier=Digi-Key; ComponentLink5URL: https://datasheet.ciiva.com/28376/e9713-acm-28376280.pdf?src-supplier=Avnet+Europe; ComponentLink5Description: https://datasheet.ciiva.com/28376/e9713-acm-28376280.pdf?src-supplier=Avnet+Europe; ComponentLink6URL: https://datasheet.ciiva.com/22726/1866262-22726282.pdf?src-supplier=Element14; ComponentLink6Description: https://datasheet.ciiva.com/22726/1866262-22726282.pdf?src-supplier=Element14; ComponentLink7URL: https://datasheet.ciiva.com/22726/1866262-22726284.pdf?src-supplier=Element14; ComponentLink7Description: https://datasheet.ciiva.com/22726/1866262-22726284.pdf?src-supplier=Element14; ComponentLink8URL: https://datasheet.ciiva.com/6216/e9713-acm-6216078.pdf?src-supplier=Digi-Key; ComponentLink8Description: https://datasheet.ciiva.com/6216/e9713-acm-6216078.pdf?src-supplier=Digi-Key
footprint FB-2824
pins: 1, 2, 3, 4

## CMC-CM2021Y330R-10
designator CMC?, comment Case Code (Imperial): 2322  Max DC Current: 15A  (hidden comment: 33R)
CMC 15A 2LN 33 OHM SMD; Manufacturer: Laird; Manufacturer Part Number: CM2021Y330R-10; Shielding: Unshielded; Number of Lines: 2; Test Frequency: 100MHz; DC Resistance (DCR): 0.75mR; Washability: OK; Supplier 1: Digi-Key; Stock 1: 77458; Pricing 1: 1=0.71, 10=0.621, 100=0.4437, 500=0.37268, 1000=0.3017 (USD); Mount: Surface Mount; Case/Package: 2021; Weight: 0.0128oz; Case Code (Metric): 5956; Min Operating Temperature: -40°C; Max Operating Temperature: 125°C; Package Quantity: 1; Packaging: Tape and Reel; Current Rating: 15A; Termination: SMD/SMT; Current: 15A; Frequency: 100MHz; Length: 0.231inch; Height: 3.8mm; Width: 5.6mm; Depth: 5.7mm; REACH SVHC: No SVHC; Lead Free: Lead Free; ComponentLink1URL: http://www.farnell.com/datasheets/1685869.pdf; ComponentLink1Description: http://www.farnell.com/datasheets/1685869.pdf; ComponentLink2URL: http://lairdtech.thomasnet.com/Asset/CM2021Y330R-10-E-2.pdf; ComponentLink2Description: http://lairdtech.thomasnet.com/Asset/CM2021Y330R-10-E-2.pdf; Supplier Part Number 1: 240-2502-6-ND; Impedance: 33R
footprint CMC-CM2021Y330R
pins: 1, 2, 3, 4

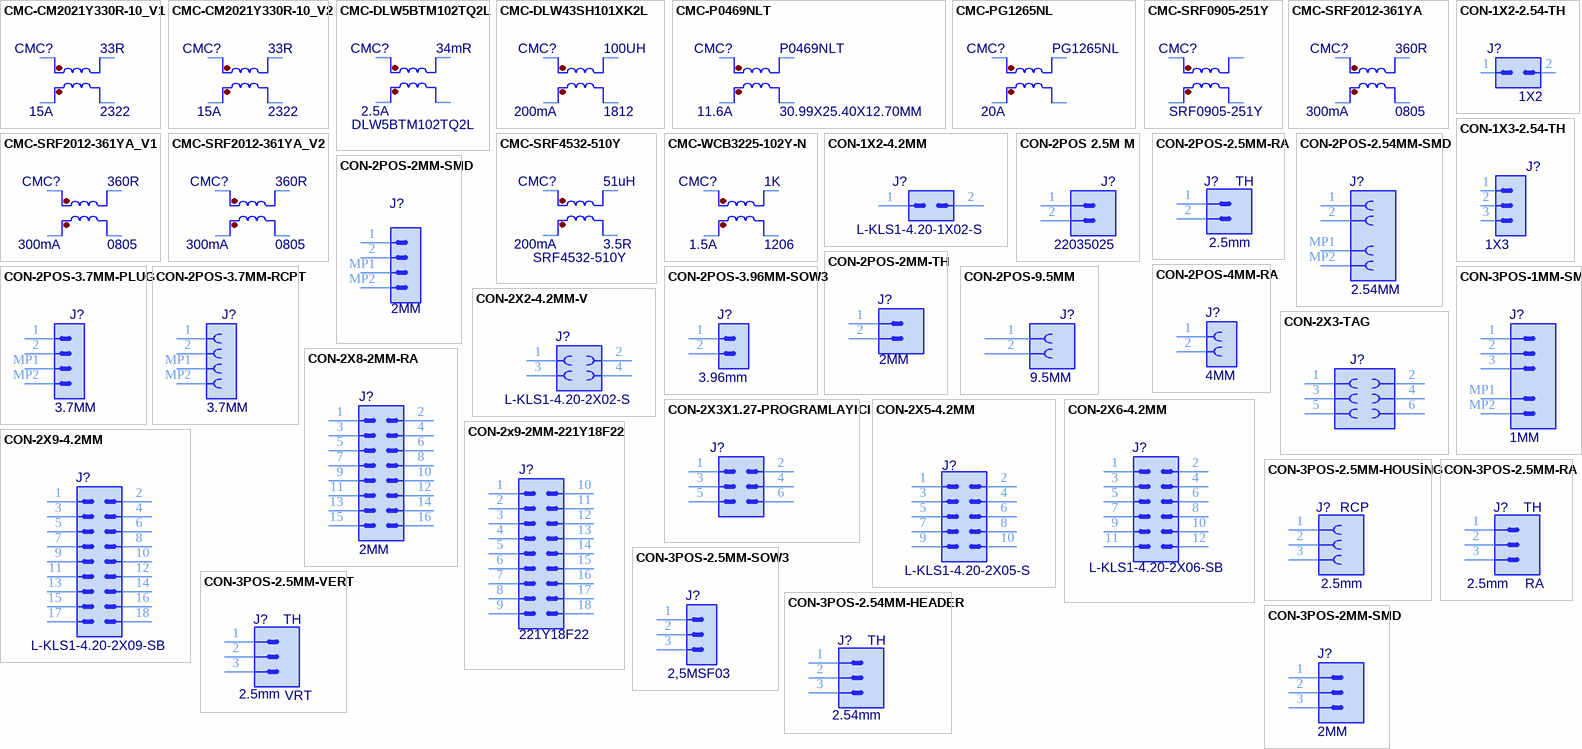
[diagram p5: symbols CMC-CM2021Y330R-10_V1 to CON-3POS-2MM-SMD]

## CMC-CM2021Y330R-10_V1
designator CMC?, comment Case Code (Imperial): 2322  Max DC Current: 15A  (hidden comment: 33R)
CMC 15A 2LN 33 OHM SMD; Manufacturer: Laird; Manufacturer Part Number: CM2021Y330R-10; Shielding: Unshielded; Number of Lines: 2; Test Frequency: 100MHz; DC Resistance (DCR): 0.75mR; Washability: OK; Supplier 1: Digi-Key; Stock 1: 77458; Pricing 1: 1=0.71, 10=0.621, 100=0.4437, 500=0.37268, 1000=0.3017 (USD); Mount: Surface Mount; Case/Package: 2021; Weight: 0.0128oz; Case Code (Metric): 5956; Min Operating Temperature: -40°C; Max Operating Temperature: 125°C; Package Quantity: 1; Packaging: Tape and Reel; Current Rating: 15A; Termination: SMD/SMT; Current: 15A; Frequency: 100MHz; Length: 0.231inch; Height: 3.8mm; Width: 5.6mm; Depth: 5.7mm; REACH SVHC: No SVHC; Lead Free: Lead Free; ComponentLink1URL: http://www.farnell.com/datasheets/1685869.pdf; ComponentLink1Description: http://www.farnell.com/datasheets/1685869.pdf; ComponentLink2URL: http://lairdtech.thomasnet.com/Asset/CM2021Y330R-10-E-2.pdf; ComponentLink2Description: http://lairdtech.thomasnet.com/Asset/CM2021Y330R-10-E-2.pdf; Supplier Part Number 1: 240-2502-6-ND; Impedance: 33R
footprint CMC-CM2021Y330R
pins: 1, 2, 3, 4

## CMC-CM2021Y330R-10_V2
designator CMC?, comment Case Code (Imperial): 2322  Max DC Current: 15A  (hidden comment: 33R)
CMC 15A 2LN 33 OHM SMD; Manufacturer: Laird; Manufacturer Part Number: CM2021Y330R-10; Shielding: Unshielded; Number of Lines: 2; Test Frequency: 100MHz; DC Resistance (DCR): 0.75mR; Washability: OK; Supplier 1: Digi-Key; Stock 1: 77458; Pricing 1: 1=0.71, 10=0.621, 100=0.4437, 500=0.37268, 1000=0.3017 (USD); Mount: Surface Mount; Case/Package: 2021; Weight: 0.0128oz; Case Code (Metric): 5956; Min Operating Temperature: -40°C; Max Operating Temperature: 125°C; Package Quantity: 1; Packaging: Tape and Reel; Current Rating: 15A; Termination: SMD/SMT; Current: 15A; Frequency: 100MHz; Length: 0.231inch; Height: 3.8mm; Width: 5.6mm; Depth: 5.7mm; REACH SVHC: No SVHC; Lead Free: Lead Free; ComponentLink1URL: http://www.farnell.com/datasheets/1685869.pdf; ComponentLink1Description: http://www.farnell.com/datasheets/1685869.pdf; ComponentLink2URL: http://lairdtech.thomasnet.com/Asset/CM2021Y330R-10-E-2.pdf; ComponentLink2Description: http://lairdtech.thomasnet.com/Asset/CM2021Y330R-10-E-2.pdf; Supplier Part Number 1: 240-2502-6-ND; Impedance: 33R
footprint CMC-CM2021Y330R
pins: 1, 2, 3, 4

## CMC-DLW5BTM102TQ2L
designator CMC?, comment DLW5BTM102TQ2L  DC Resistance (DCR): 34mR  Max Current Rating: 2.5A
CMC 2.5A 2LN 1 KOHM SMD; Manufacturer: Murata; Number of Lines: 2; Voltage Rating (DC): 50V; Impedance: 1kR; Supplier 1: Digi-Key; Supplier Part Number 1: 490-14403-1-ND; Manufacturer Part Number: DLW5BTM102TQ2L; Pricing: 1=1.19, 10=1.102, 25=1.0168, 50=0.8474, 100=0.7966, 250=0.7119 (USD); RoHS: No; Mount: Surface Mount; Min Operating Temperature: -40°C; Max Operating Temperature: 105°C; Packaging: Tape and Reel; Length: 5mm; Width: 5mm; Lead Free: Lead Free; ComponentLink1URL: https://www.murata.com/en-us/products/productdata/8796761587742/EFLC0025.pdf?src-supplier=Digi-Key; ComponentLink1Description: https://www.murata.com/en-us/products/productdata/8796761587742/EFLC0025.pdf?src-supplier=Digi-Key; Stock: 6882
footprint CMC-DLW5BTM
pins: 1, 2, 3, 4

## CMC-DLW43SH101XK2L
designator CMC?, comment 100UH  Case/Package: 1812  DC Current: 200mA
CMC 100UH 200MA 2LN SMD AEC-Q200; Manufacturer: Murata; Manufacturer Part Number: DLW43SH101XK2L; Number of Lines: 2; Tolerance: 50%; Voltage Rating: 50V; Shielding: Unshielded; DC Resistance (DCR): 2R; Test Frequency: 1MHz; Washability: OK; Supplier 1: Digi-Key; Stock 1: 114520; Pricing 1: 1 = 1.25000, 10 = 1.16400, 100 = 0.84130 (USD); RoHS: Yes; Mount: Surface Mount; Weight: 0.005997oz; Case Code (Metric): 4532; Case Code (Imperial): 1812; Min Operating Temperature: -40°C; Max Operating Temperature: 125°C; Package Quantity: 1; Packaging: Tape and Reel; Current Rating: 200mA; Inductance: 100uH; Current: 200mA; Max DC Current: 200mA; Termination: SMD/SMT; Military Standard: Not; Length: 4.5mm; Height: 2.6mm; Width: 0.126inch; Depth: 3.4mm; Radiation Hardening: No; REACH SVHC: No SVHC; Lead Free: Lead Free; ComponentLink1URL: https://www.verical.com/server-webapp/html/getDatasheet?partID=442532&src-supplier=Verical; ComponentLink1Description: https://www.verical.com/server-webapp/html/getDatasheet?partID=442532&src-supplier=Verical; ComponentLink2URL: http://search.murata.co.jp/Ceramy/image/img/PDF/ENG/L0132S0197DLW43S.pdf?src-supplier=Avnet; ComponentLink2Description: http://search.murata.co.jp/Ceramy/image/img/PDF/ENG/L0132S0197DLW43S.pdf?src-supplier=Avnet; ComponentLink3URL: http://www.murata.com/en-eu/products/productdata/8796758605854/QFLC9101.pdf?src-supplier=Digi-Key; ComponentLink3Description: http://www.murata.com/en-eu/products/productdata/8796758605854/QFLC9101.pdf?src-supplier=Digi-Key; ComponentLink4URL: http://search.murata.co.jp/Ceramy/image/img/PDF/ENG/L0132S0197DLW43S.pdf?src-supplier=Avnet+Europe; ComponentLink4Description: http://search.murata.co.jp/Ceramy/image/img/PDF/ENG/L0132S0197DLW43S.pdf?src-supplier=Avnet+Europe; ComponentLink5URL: http://www.murata.com/products/catalog/pdf/k35e.pdf?src-supplier=Future+Electronics; ComponentLink5Description: http://www.murata.com/products/catalog/pdf/k35e.pdf?src-supplier=Future+Electronics; ComponentLink6URL: https://media.digikey.com/pdf/Data%20Sheets/Murata%20PDFs/DLx_Series.pdf?src-supplier=Digi-Key; ComponentLink6Description: https://media.digikey.com/pdf/Data%20Sheets/Murata%20PDFs/DLx_Series.pdf?src-supplier=Digi-Key; Supplier Part Number 1: 490-7979-1-ND
footprint CMC-1812
pins: 1, 2, 3, 4

## CMC-P0469NLT
designator CMC?, comment P0469NLT  Current: 11.6A  Case/Package: 30.99X25.40X12.70MM
COMMON MODE CHOKE 11.6A 2LN SMD; Manufacturer: Pulse Electronics; Inductance: 630uH; DC Resistance (DCR): 10mR; Tolerance: 35%; Number of Lines: 2; Shielding: Unshielded; Washability: OK; Supplier 1: Digi-Key; Manufacturer Part Number: P0469NLT; Stock 1: 4290; Pricing 1: 1=4.24, 10=3.887 (USD); Mount: Surface Mount; Number of Pins: 4; Min Operating Temperature: -40°C; Max Operating Temperature: 120°C; Packaging: Tape and Reel; Max DC Current: 11.6A; DC Current: 11.6A; Military Standard: Not; Package Quantity: 1; Termination: SMD/SMT; Length: 30.99mm; Height: 12.7mm; Depth: 25.4mm; Width: 1inch; Radiation Hardening: No; REACH SVHC: No SVHC; ComponentLink1URL: http://uk.rs-online.com/webdocs/0fe2/0900766b80fe229e.pdf?src-supplier=RSComponents; ComponentLink1Description: http://uk.rs-online.com/webdocs/0fe2/0900766b80fe229e.pdf?src-supplier=RSComponents; ComponentLink2URL: http://productfinder.pulseeng.com/products/datasheets/SPM2007_63.pdf?src-supplier=Digi-Key; ComponentLink2Description: http://productfinder.pulseeng.com/products/datasheets/SPM2007_63.pdf?src-supplier=Digi-Key; Supplier Part Number 1: 553-1938-1-ND
footprint CMC-P0469NLT
pins: 1, 2, 3, 4

## CMC-PG1265NL
designator CMC?, comment PG1265NL  Max Current Rating: 20A
COMMON MODE CHOKE 20A 2LN SMD; Manufacturer: Pulse; Number of Lines: 2; DC Resistance (DCR): 4.1mR; Supplier 1: Digi-Key; Supplier Part Number 1: 553-3913-5-ND; Manufacturer Part Number: PG1265NL; Stock: 2073; Pricing: 1=3.54, 10=3.245, 25=2.95, 50=2.478, 100=2.124, 250=2.006, 500=1.888, 1000=1.77, 2500=1.711 (USD); RoHS: Yes; Mount: Surface Mount; Min Operating Temperature: -40°C; Max Operating Temperature: 130°C; Package Quantity: 20; Packaging: Tray; Length: 1.22inch; Width: 1inch; Height: 0.5inch; ComponentLink1URL: http://productfinder.pulseeng.com/products/datasheets/P688.pdf?src-supplier=Digi-Key; ComponentLink1Description: http://productfinder.pulseeng.com/products/datasheets/P688.pdf?src-supplier=Digi-Key; ComponentLink2URL: https://productfinder.pulseeng.com/doc_type/WEB301/doc_num/P688/doc_part/P688.pdf?src-supplier=Digi-Key; ComponentLink2Description: https://productfinder.pulseeng.com/doc_type/WEB301/doc_num/P688/doc_part/P688.pdf?src-supplier=Digi-Key
footprint CMC-P0469NLT
pins: 1, 2, 3, 4

## CMC-SRF0905-251Y
designator CMC?, comment SRF0905-251Y
BOURNS   SRF0905-251Y   COMMON MODE CHOKE, 250UH, 1.2A, 50%; Core Material: Ferrite; Voltage Rating (DC): 50V; Impedance: 600R; Number of Lines: 2; Frequency: 20MHz; DC Resistance (DCR): 130mR; Test Frequency: 100kHz; Element Configuration: Dual; Washability: OK; Supplier 1: Digi-Key; Manufacturer: Bourns; Manufacturer Part Number: SRF0905-251Y; Stock 1: 23724; Pricing 1: 1=1.45000, 10=1.34600, 100=0.97290, 500=0.74520 (USD); RoHS: Yes; Mount: Surface Mount; Case/Package: 0905; Number of Pins: 4; Material: Polymer; Min Operating Temperature: -40°C; Max Operating Temperature: 105°C; Tolerance: 50%; Packaging: Tape and Reel; Package Quantity: 1000; Inductance: 250uH; Current Rating: 1.2A; Max DC Current: 1.2A; Termination: SMD/SMT; Current: 1.2A; DC Current: 1.2A; Self Resonant Frequency: 20MHz; Length: 9.2mm; Height: 5mm; Width: 6mm; Depth: 6.3mm; Radiation Hardening: No; REACH SVHC: No SVHC; ComponentLink1URL: https://datasheet.ciiva.com/4943/srf0905-32579-4943008.pdf?src-supplier=Mouser; ComponentLink1Description: https://datasheet.ciiva.com/4943/srf0905-32579-4943008.pdf?src-supplier=Mouser; ComponentLink2URL: https://datasheet.ciiva.com/1127/1831485-1127680.pdf?src-supplier=Element14; ComponentLink2Description: https://datasheet.ciiva.com/1127/1831485-1127680.pdf?src-supplier=Element14; ComponentLink3URL: https://datasheet.ciiva.com/22715/1831485-22715657.pdf?src-supplier=Element14; ComponentLink3Description: https://datasheet.ciiva.com/22715/1831485-22715657.pdf?src-supplier=Element14; ComponentLink4URL: https://datasheet.ciiva.com/30254/887srf0905-30254281.pdf?src-supplier=Onlinecomponents.com; ComponentLink4Description: https://datasheet.ciiva.com/30254/887srf0905-30254281.pdf?src-supplier=Onlinecomponents.com; ComponentLink5URL: https://datasheet.ciiva.com/6216/srf0905-6216427.pdf?src-supplier=Digi-Key; ComponentLink5Description: https://datasheet.ciiva.com/6216/srf0905-6216427.pdf?src-supplier=Digi-Key; ComponentLink6URL: https://datasheet.ciiva.com/11155/srf0905-11155307.pdf?src-supplier=Avnet; ComponentLink6Description: https://datasheet.ciiva.com/11155/srf0905-11155307.pdf?src-supplier=Avnet; ComponentLink7URL: https://datasheet.ciiva.com/6216/srf0905-6216428.pdf?src-supplier=Digi-Key; ComponentLink7Description: https://datasheet.ciiva.com/6216/srf0905-6216428.pdf?src-supplier=Digi-Key; ComponentLink8URL: https://datasheet.ciiva.com/6216/srf0905-6216431.pdf?src-supplier=Digi-Key; ComponentLink8Description: https://datasheet.ciiva.com/6216/srf0905-6216431.pdf?src-supplier=Digi-Key; Supplier Part Number 1: SRF0905-251YCT-ND
footprint 4 PC Pad (0.362" L x 0.236" W (9.20mm x 6.00mm))
pins: 1, 2, 3, 4

## CMC-SRF2012-361YA
designator CMC?, comment Case/Package: 0805  Max DC Current: 300mA  (hidden comment: 360R)
CMC 300MA 2LN 360 OHM SMD; Manufacturer: Bourns; Manufacturer Part Number: SRF2012-361YA; Core Material: Ferrite; Tolerance: 25%; Shielding: Unshielded; Number of Lines: 2; DC Resistance (DCR): 450mR; Test Frequency: 100MHz; Voltage Rating (DC): 50V; Element Configuration: Dual; Insulation Resistance: 10MR; Washability: OK; Supplier 1: Digi-Key; Stock 1: 68554; Pricing 1: 1=0.36, 10=0.322, 100=0.2214, 500=0.18918, 1000=0.1449 (USD); Mount: PCB,Surface Mount; Material: Steel; Min Operating Temperature: -40°C; Max Operating Temperature: 125°C; Packaging: Tape and Reel; Package Quantity: 1; Resistance: 360R; Current Rating: 300mA; Termination: SMD/SMT; Current: 300mA; DC Current: 300mA; Length: 2mm; Height: 1.2mm; Width: 1.2mm; Depth: 1.4mm; REACH SVHC: No SVHC; Halogen Free: Halogen Free; ComponentLink1URL: https://www.bourns.com/docs/Product-Datasheets/SRF2012A.pdf; ComponentLink1Description: https://www.bourns.com/docs/Product-Datasheets/SRF2012A.pdf; ComponentLink2URL: http://www.bourns.com/docs/Product-Datasheets/SRF2012A.pdf; ComponentLink2Description: http://www.bourns.com/docs/Product-Datasheets/SRF2012A.pdf; ComponentLink3URL: http://uk.rs-online.com/webdocs/0fa5/0900766b80fa59a2.pdf; ComponentLink3Description: http://uk.rs-online.com/webdocs/0fa5/0900766b80fa59a2.pdf; Supplier Part Number 1: SRF2012-361YADKR-ND; Impedance: 360R
footprint CMC-SRF2012A
pins: 1, 2, 3, 4
